# Altium footprint library MyPcbLib.PcbLib: 657 footprints (part 18 of 42)
Each footprint in its own frame and in the unit in brackets; x right, y up, seen from the top. Pads: shape width x height; smd on the part's side, far side on the other; paste and mask are expansions set on the pad; w line width, h text height; cw(c..) or ccw(c..) is an arc to the next point about the centre after c.
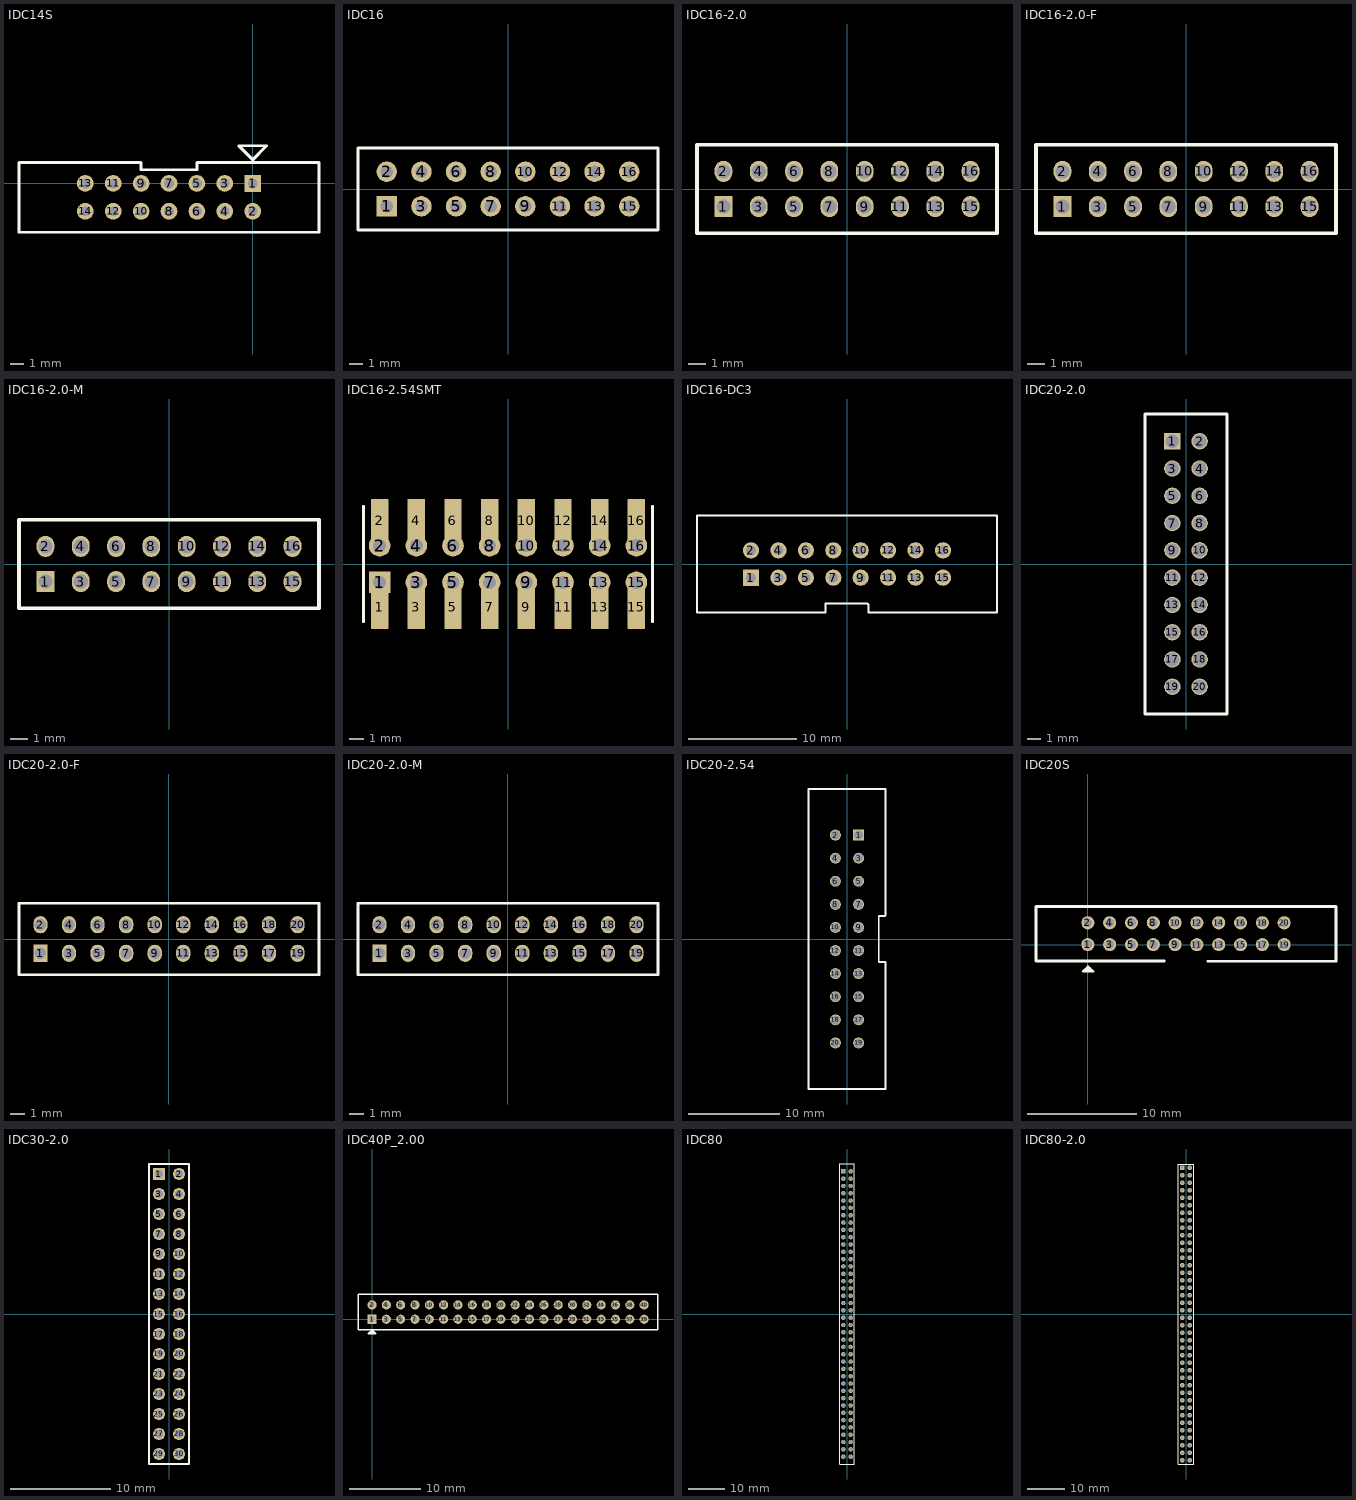
[diagram p17: the footprints below, top view; thin cyan lines are the x and y axes]

## IDC14S [mm]
pads (14):
  rect 1.2x1.2 hole 0.7: 1(0.002,-0.001)
  round 1.2 hole 0.7: 2(0.002,-2.001) 3(-1.998,-0.001) 4(-1.998,-2.001) 5(-3.998,-0.001) 6(-3.998,-2.001) 7(-5.998,-0.001) 8(-5.998,-2.001) 9(-7.998,-0.001) 10(-7.998,-2.001) 11(-9.998,-0.001) 12(-9.998,-2.001) 13(-11.998,-0.001) 14(-11.998,-2.001)
Top Overlay:
  lines w0.2: -16.748,-3.501 4.752,-3.501 4.752,1.499 -3.998,1.499 -3.998,0.974 -7.998,0.974 -7.998,1.499 -16.748,1.499 -16.748,-3.501 ; -0.998,2.699 1.002,2.699 0.002,1.699 -0.998,2.699

## IDC16 [mm] "Connector; Header; 8x2 Position"
pads (16):
  rect 1.5x1.5 hole 0.9: 1(-8.89,-1.27)
  round 1.5 hole 0.9: 2(-8.89,1.27) 3(-6.35,-1.27) 4(-6.35,1.27) 5(-3.81,-1.27) 6(-3.81,1.27) 7(-1.27,-1.27) 8(-1.27,1.27) 9(1.27,-1.27) 10(1.27,1.27) 11(3.81,-1.27) 12(3.81,1.27) 13(6.35,-1.27) 14(6.35,1.27) 15(8.89,-1.27) 16(8.89,1.27)
Top Overlay:
  lines w0.2: -11,-3 11,-3 11,3 -11,3 -11,-3
3D body: height 7.62, standoff -1.6, extent -10.211,-2.388 -0.051,2.612
3D body: height 7.62, standoff -1.6, extent -0.025,-2.398 10.135,2.602

## IDC16-2.0 [mm]
pads (16):
  rect 1x1.2 hole 0.8: 1(-7,-1)
  oval 1x1.2 hole 0.8: 2(-7,1) 3(-5,-1) 4(-5,1) 5(-3,-1) 6(-3,1) 7(-1,-1) 8(-1,1) 9(1,-1) 10(1,1) 11(3,-1) 12(3,1) 13(5,-1) 14(5,1) 15(7,-1) 16(7,1)
Top Overlay:
  lines w0.203: -8.5,-2.5 8.5,-2.5 8.5,2.5 -8.5,2.5 -8.5,-2.5
3D body: height 1, standoff -10, extent -8.101,-1.975 7.899,2.025

## IDC16-2.0-F [mm]
pads (16):
  rect 1x1.2 hole 0.8: 1(-7,-1)
  oval 1x1.2 hole 0.8: 2(-7,1) 3(-5,-1) 4(-5,1) 5(-3,-1) 6(-3,1) 7(-1,-1) 8(-1,1) 9(1,-1) 10(1,1) 11(3,-1) 12(3,1) 13(5,-1) 14(5,1) 15(7,-1) 16(7,1)
Top Overlay:
  lines w0.203: -8.5,-2.5 8.5,-2.5 8.5,2.5 -8.5,2.5 -8.5,-2.5
3D body: height 6, standoff -2, extent -7.976,-1.993 8.024,2.007

## IDC16-2.0-M [mm]
pads (16):
  rect 1x1.2 hole 0.8: 1(-7,-1)
  oval 1x1.2 hole 0.8: 2(-7,1) 3(-5,-1) 4(-5,1) 5(-3,-1) 6(-3,1) 7(-1,-1) 8(-1,1) 9(1,-1) 10(1,1) 11(3,-1) 12(3,1) 13(5,-1) 14(5,1) 15(7,-1) 16(7,1)
Top Overlay:
  lines w0.203: -8.5,-2.5 -8.5,2.5 8.5,2.5 8.5,-2.5 -8.5,-2.5
3D body: height 4, standoff -2, extent -7.975,-2.007 8.025,1.993

## IDC16-2.54SMT [mm] "Connector; Header; 8x2 Position"
pads (32):
  rect 1.2x3 smd: 1(-8.89,-3) 2(-8.89,3) 3(-6.35,-3) 4(-6.35,3) 5(-3.81,-3) 6(-3.81,3) 7(-1.27,-3) 8(-1.27,3) 9(1.27,-3) 10(1.27,3) 11(3.81,-3) 12(3.81,3) 13(6.35,-3) 14(6.35,3) 15(8.89,-3) 16(8.89,3)
  rect 1.5x1.5 hole 0.9: 1(-8.89,-1.27)
  round 1.5 hole 0.9: 2(-8.89,1.27) 3(-6.35,-1.27) 4(-6.35,1.27) 5(-3.81,-1.27) 6(-3.81,1.27) 7(-1.27,-1.27) 8(-1.27,1.27) 9(1.27,-1.27) 10(1.27,1.27) 11(3.81,-1.27) 12(3.81,1.27) 13(6.35,-1.27) 14(6.35,1.27) 15(8.89,-1.27) 16(8.89,1.27)
Top Overlay:
  lines w0.2: -10,-4 -10,4 ; 10,-4 10,4

## IDC16-DC3 [mm] "Connector; Header; 8x2 Position"
pads (16):
  rect 1.5x1.5 hole 0.9: 1(-8.89,-1.27)
  round 1.5 hole 0.9: 2(-8.89,1.27) 3(-6.35,-1.27) 4(-6.35,1.27) 5(-3.81,-1.27) 6(-3.81,1.27) 7(-1.27,-1.27) 8(-1.27,1.27) 9(1.27,-1.27) 10(1.27,1.27) 11(3.81,-1.27) 12(3.81,1.27) 13(6.35,-1.27) 14(6.35,1.27) 15(8.89,-1.27) 16(8.89,1.27)
Top Overlay:
  lines w0.2: -2,-4.5 -13.89,-4.5 -13.89,4.5 13.89,4.5 13.89,-4.5 2,-4.5
  lines w0.203: -2,-4.5 -2,-3.651 1.873,-3.651 2,-3.778 2,-4.5
3D body: height 7.62, standoff -1.6, extent -0.025,-2.398 10.135,2.602
3D body: height 7.62, standoff -1.6, extent -10.211,-2.388 -0.051,2.612

## IDC20-2.0 [mm]
pads (20):
  rect 1.2x1.2 hole 1: 1(-1,9)
  round 1.2 hole 1: 2(1,9) 3(-1,7) 4(1,7) 5(-1,5) 6(1,5) 7(-1,3) 8(1,3) 9(-1,1) 10(1,1) 11(-1,-1) 12(1,-1) 13(-1,-3) 14(1,-3) 15(-1,-5) 16(1,-5) 17(-1,-7) 18(1,-7) 19(-1,-9) 20(1,-9)
Top Overlay:
  lines w0.203: -3,-11 3,-11 3,11 -3,11 -3,-11

## IDC20-2.0-F [mm]
pads (20):
  rect 1x1.2 hole 0.8: 1(-9,-1)
  oval 1x1.2 hole 0.8: 2(-9,1) 3(-7,-1) 4(-7,1) 5(-5,-1) 6(-5,1) 7(-3,-1) 8(-3,1) 9(-1,-1) 10(-1,1) 11(1,-1) 12(1,1) 13(3,-1) 14(3,1) 15(5,-1) 16(5,1) 17(7,-1) 18(7,1) 19(9,-1) 20(9,1)
Top Overlay:
  lines w0.203: -10.5,-2.5 -10.5,2.5 10.5,2.5 10.5,-2.5 -10.5,-2.5

## IDC20-2.0-M [mm]
pads (20):
  rect 1x1.2 hole 0.8: 1(-9,-1)
  oval 1x1.2 hole 0.8: 2(-9,1) 3(-7,-1) 4(-7,1) 5(-5,-1) 6(-5,1) 7(-3,-1) 8(-3,1) 9(-1,-1) 10(-1,1) 11(1,-1) 12(1,1) 13(3,-1) 14(3,1) 15(5,-1) 16(5,1) 17(7,-1) 18(7,1) 19(9,-1) 20(9,1)
Top Overlay:
  lines w0.203: -10.5,-2.5 -10.5,2.5 10.5,2.5 10.5,-2.5 -10.5,-2.5

## IDC20-2.54 [mm]
pads (20):
  rect 1.2x1.2 hole 1: 1(1.27,11.43)
  round 1.2 hole 1: 2(-1.27,11.43) 3(1.27,8.89) 4(-1.27,8.89) 5(1.27,6.35) 6(-1.27,6.35) 7(1.27,3.81) 8(-1.27,3.81) 9(1.27,1.27) 10(-1.27,1.27) 11(1.27,-1.27) 12(-1.27,-1.27) 13(1.27,-3.81) 14(-1.27,-3.81) 15(1.27,-6.35) 16(-1.27,-6.35) 17(1.27,-8.89) 18(-1.27,-8.89) 19(1.27,-11.43) 20(-1.27,-11.43)
Top Overlay:
  lines w0.203: 4.199,2.54 3.5,2.54 3.5,-2.54 4.225,-2.54 4.225,-16.5 ; 4.25,-16.5 -4.25,-16.5 -4.25,16.5 4.25,16.5 4.25,2.591
3D body: height 8.9, standoff -1.1, extent -4.209,-16.5 4.191,16.5

## IDC20S [mm]
pads (20):
  round 1.2 hole 0.8: 1(0.006,0) 2(0.006,2) 3(2.006,0) 4(2.006,2) 5(4.006,0) 6(4.006,2) 7(6.006,0) 8(6.006,2) 9(8.006,0) 10(8.006,2) 11(10.006,0) 12(10.006,2) 13(12.006,0) 14(12.006,2) 15(14.006,0) 16(14.006,2) 17(16.006,0) 18(16.006,2) 19(18.006,0) 20(18.006,2)
Top Overlay:
  lines w0.2: 0.318,-2.287 -0.228,-2.287 -0.242,-2.274 0.112,-2.274 0.208,-2.177 0.208,-2.248 -0.019,-2.475 -0.019,-2.05 0.006,-2.025 ; 0.006,-2.025 -0.444,-2.475 0.306,-2.475 0.506,-2.475 0.056,-2.025 0.006,-2.025
  lines w0.254: 7.006,-1.5 -4.744,-1.5 -4.744,3.5 22.756,3.5 22.756,-1.5 ; 11.006,-1.525 22.756,-1.525

## IDC30-2.0 [mm]
pads (30):
  rect 1.2x1.2 hole 0.8: 1(-1,14)
  round 1.2 hole 0.8: 2(1,14) 3(-1,12) 4(1,12) 5(-1,10) 6(1,10) 7(-1,8) 8(1,8) 9(-1,6) 10(1,6) 11(-1,4) 12(1,4) 13(-1,2) 14(1,2) 15(-1,0) 16(1,0) 17(-1,-2) 18(1,-2) 19(-1,-4) 20(1,-4) 21(-1,-6) 22(1,-6) 23(-1,-8) 24(1,-8) 25(-1,-10) 26(1,-10) 27(-1,-12) 28(1,-12) 29(-1,-14) 30(1,-14)
Top Overlay:
  lines w0.203: -2,-15 -2,15 2,15 2,-15 -2,-15

## IDC40P_2.00 [mm]
pads (40):
  rect 1.27x1.27 hole 0.7: 1(-0.011,0.011)
  round 1.27 hole 0.7: 2(-0.011,2.011) 3(1.989,0.011) 4(1.989,2.011) 5(3.989,0.011) 6(3.989,2.011) 7(5.989,0.011) 8(5.989,2.011) 9(7.989,0.011) 10(7.989,2.011) 11(9.989,0.011) 12(9.989,2.011) 13(11.989,0.011) 14(11.989,2.011) 15(13.989,0.011) 16(13.989,2.011) 17(15.989,0.011) 18(15.989,2.011) 19(17.989,0.011) 20(17.989,2.011) 21(19.989,0.011) 22(19.989,2.011) 23(21.989,0.011) 24(21.989,2.011) 25(23.989,0.011) 26(23.989,2.011) 27(25.989,0.011) 28(25.989,2.011) 29(27.989,0.011) 30(27.989,2.011) 31(29.989,0.011) 32(29.989,2.011) 33(31.989,0.011) 34(31.989,2.011) 35(33.989,0.011) 36(33.989,2.011) 37(35.989,0.011) 38(35.989,2.011) 39(37.989,0.011) 40(37.989,2.011)
Top Overlay:
  lines w0.2: -1.972,-1.489 39.928,-1.489 39.928,3.511 -1.972,3.511 -1.972,-1.489
  lines w0.254: -0.372,-1.874 0.32,-1.874 ; -0.257,-1.758 0.235,-1.758 ; -0.011,-1.489 -0.011,-1.513 ; -0.011,-1.513 0.497,-2.021 -0.519,-2.021 -0.011,-1.513

## IDC80 [mm]
pads (80):
  rect 1.2x1.2 hole 1: 1(-1,39)
  round 1.2 hole 1: 2(1,39) 3(-1,37) 4(1,37) 5(-1,35) 6(1,35) 7(-1,33) 8(1,33) 9(-1,31) 10(1,31) 11(-1,29) 12(1,29) 13(-1,27) 14(1,27) 15(-1,25) 16(1,25) 17(-1,23) 18(1,23) 19(-1,21) 20(1,21) 21(-1,19) 22(1,19) 23(-1,17) 24(1,17) 25(-1,15) 26(1,15) 27(-1,13) 28(1,13) 29(-1,11) 30(1,11) 31(-1,9) 32(1,9) 33(-1,7) 34(1,7) 35(-1,5) 36(1,5) 37(-1,3) 38(1,3) 39(-1,1) 40(1,1) 41(-1,-1) 42(1,-1) 43(-1,-3) 44(1,-3) 45(-1,-5) 46(1,-5) 47(-1,-7) 48(1,-7) 49(-1,-9) 50(1,-9) 51(-1,-11) 52(1,-11) 53(-1,-13) 54(1,-13) 55(-1,-15) 56(1,-15) 57(-1,-17) 58(1,-17) 59(-1,-19) 60(1,-19) 61(-1,-21) 62(1,-21) 63(-1,-23) 64(1,-23) 65(-1,-25) 66(1,-25) 67(-1,-27) 68(1,-27) 69(-1,-29) 70(1,-29) 71(-1,-31) 72(1,-31) 73(-1,-33) 74(1,-33) 75(-1,-35) 76(1,-35) 77(-1,-37) 78(1,-37) 79(-1,-39) 80(1,-39)
Top Overlay:
  lines w0.203: -2,-41 -2,41 2,41 2,-41 -2,-41

## IDC80-2.0 [mm]
pads (80):
  rect 1.2x1.2 hole 0.8: 1(-1,39)
  round 1.2 hole 0.8: 2(1,39) 3(-1,37) 4(1,37) 5(-1,35) 6(1,35) 7(-1,33) 8(1,33) 9(-1,31) 10(1,31) 11(-1,29) 12(1,29) 13(-1,27) 14(1,27) 15(-1,25) 16(1,25) 17(-1,23) 18(1,23) 19(-1,21) 20(1,21) 21(-1,19) 22(1,19) 23(-1,17) 24(1,17) 25(-1,15) 26(1,15) 27(-1,13) 28(1,13) 29(-1,11) 30(1,11) 31(-1,9) 32(1,9) 33(-1,7) 34(1,7) 35(-1,5) 36(1,5) 37(-1,3) 38(1,3) 39(-1,1) 40(1,1) 41(-1,-1) 42(1,-1) 43(-1,-3) 44(1,-3) 45(-1,-5) 46(1,-5) 47(-1,-7) 48(1,-7) 49(-1,-9) 50(1,-9) 51(-1,-11) 52(1,-11) 53(-1,-13) 54(1,-13) 55(-1,-15) 56(1,-15) 57(-1,-17) 58(1,-17) 59(-1,-19) 60(1,-19) 61(-1,-21) 62(1,-21) 63(-1,-23) 64(1,-23) 65(-1,-25) 66(1,-25) 67(-1,-27) 68(1,-27) 69(-1,-29) 70(1,-29) 71(-1,-31) 72(1,-31) 73(-1,-33) 74(1,-33) 75(-1,-35) 76(1,-35) 77(-1,-37) 78(1,-37) 79(-1,-39) 80(1,-39)
Top Overlay:
  lines w0.203: -2,-40 2,-40 2,40 -2,40 -2,-40